# Altium footprint library others.PcbLib: 50 footprints (part 4 of 4)
Each footprint in its own frame and in the unit in brackets; x right, y up, seen from the top. Pads: shape width x height; smd on the part's side, far side on the other; paste and mask are expansions set on the pad; w line width, h text height; cw(c..) or ccw(c..) is an arc to the next point about the centre after c.
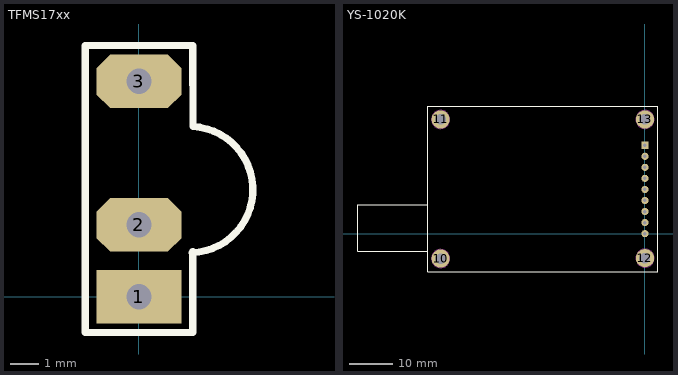
[diagram p3: the footprints below, top view; thin cyan lines are the x and y axes]

## TFMS17xx [mm]
pads (3):
  rect 3x1.9 hole 0.9: 1(0,0)
  oct 3x1.9 hole 0.9: 2(0,2.54) 3(0,7.62)
Top Overlay:
  lines w0.254: 1.872,1.556 ccw(c1.796,3.789) 1.908,6.021 1.905,8.89 -1.905,8.89 -1.905,3.81 -1.905,-1.27 1.905,-1.27 1.902,1.599

## YS-1020K [mm]
pads (13):
  rect 1.651x1.651 hole 0.8: 1(0,20.36)
  round 1.651 hole 0.8: 2(0,17.82) 3(0,15.28) 4(0,12.74) 5(0,10.2) 6(0,7.66) 7(0,5.12) 8(0,2.58) 9(0,0.04)
  round 4.2 hole 2.4: 10(-47,-5.7) 11(-47,26.3) 12(0,-5.6) 13(0,26.3)
Top Overlay:
  lines w0.254: -50,-4 -66,-4 -66,6.7 -50,6.7 -50,29.3 3,29.3 3,-8.7 -50,-8.7 -50,22.8
Keep-Out Layer:
  circle w0.254: c0,-5.6 r2.1
  circle w0.254: c0,26.3 r2.1
  circle w0.254: c-47,26.3 r2.1
  circle w0.254: c-47,-5.7 r2.1